# Altium footprint library SAMTEC SMD.PcbLib: 165 footprints (part 7 of 17) (continued)
## SAMTEC_GFZ-30-01-G-10-AD_TOP [mm] "Z-Beam, High Speed 300 Pins, Pitch 1.27mm, Low Profile 1.65mm, Grid Array (30x10) Solderless SMT Board Stacking Connector" (continued)
  region: 16.696,-4.152 17.586,-4.152 17.586,-5.042 16.696,-5.042
  region: 15.426,-4.152 16.316,-4.152 16.316,-5.042 15.426,-5.042
  region: 14.156,-4.152 15.046,-4.152 15.046,-5.042 14.156,-5.042
  region: 12.886,-4.152 13.776,-4.152 13.776,-5.042 12.886,-5.042
  region: 11.616,-4.152 12.506,-4.152 12.506,-5.042 11.616,-5.042
  region: 10.346,-4.152 11.236,-4.152 11.236,-5.042 10.346,-5.042
  region: 9.076,-4.152 9.966,-4.152 9.966,-5.042 9.076,-5.042
  region: 7.806,-4.152 8.696,-4.152 8.696,-5.042 7.806,-5.042
  region: 6.536,-4.152 7.426,-4.152 7.426,-5.042 6.536,-5.042
  region: 5.266,-4.152 6.156,-4.152 6.156,-5.042 5.266,-5.042
  region: 3.996,-4.152 4.886,-4.152 4.886,-5.042 3.996,-5.042
  region: 2.726,-4.152 3.616,-4.152 3.616,-5.042 2.726,-5.042
  region: 1.456,-4.152 2.346,-4.152 2.346,-5.042 1.456,-5.042
  region: 0.186,-4.152 1.076,-4.152 1.076,-5.042 0.186,-5.042
  region: -1.084,-4.152 -0.194,-4.152 -0.194,-5.042 -1.084,-5.042
  region: -2.354,-4.152 -1.464,-4.152 -1.464,-5.042 -2.354,-5.042
  region: -3.624,-4.152 -2.734,-4.152 -2.734,-5.042 -3.624,-5.042
  region: -4.894,-4.152 -4.004,-4.152 -4.004,-5.042 -4.894,-5.042
  region: -6.164,-4.152 -5.274,-4.152 -5.274,-5.042 -6.164,-5.042
  region: 16.696,-5.422 17.586,-5.422 17.586,-6.312 16.696,-6.312
  region: 15.426,-5.422 16.316,-5.422 16.316,-6.312 15.426,-6.312
  region: 14.156,-5.422 15.046,-5.422 15.046,-6.312 14.156,-6.312
  region: 12.886,-5.422 13.776,-5.422 13.776,-6.312 12.886,-6.312
  region: 11.616,-5.422 12.506,-5.422 12.506,-6.312 11.616,-6.312
  region: 10.346,-5.422 11.236,-5.422 11.236,-6.312 10.346,-6.312
  region: 9.076,-5.422 9.966,-5.422 9.966,-6.312 9.076,-6.312
  region: 7.806,-5.422 8.696,-5.422 8.696,-6.312 7.806,-6.312
  region: 6.536,-5.422 7.426,-5.422 7.426,-6.312 6.536,-6.312
  region: 5.266,-5.422 6.156,-5.422 6.156,-6.312 5.266,-6.312
  region: 3.996,-5.422 4.886,-5.422 4.886,-6.312 3.996,-6.312
  region: 2.726,-5.422 3.616,-5.422 3.616,-6.312 2.726,-6.312
  region: 1.456,-5.422 2.346,-5.422 2.346,-6.312 1.456,-6.312
  region: 0.186,-5.422 1.076,-5.422 1.076,-6.312 0.186,-6.312
  region: -1.084,-5.422 -0.194,-5.422 -0.194,-6.312 -1.084,-6.312
  region: -2.354,-5.422 -1.464,-5.422 -1.464,-6.312 -2.354,-6.312
  region: -3.624,-5.422 -2.734,-5.422 -2.734,-6.312 -3.624,-6.312
  region: -4.894,-5.422 -4.004,-5.422 -4.004,-6.312 -4.894,-6.312
  region: -6.164,-5.422 -5.274,-5.422 -5.274,-6.312 -6.164,-6.312
Bottom Layer keep-out:
  circle w0.1: c13.081,-10.16 r2.9
  circle w0.1: c13.081,10.16 r2.9
  circle w0.1: c-13.339,-10.16 r2.9
  circle w0.1: c-13.339,10.16 r2.9
Top Overlay:
  drawing of 311 lines, arcs and shapes, not listed
  text "300" at -21.131,-6.085 h1
  text "1" at 19.535,5.106 h1
Mechanical 8:
  drawing of 3026 lines, arcs and shapes, not listed
Mechanical 14:
  drawing of 487 lines, arcs and shapes, not listed
  text "300" at -21.131,-6.085 h1
  text "1" at 19.535,5.106 h1
Mechanical 15:
  lines w0.05: -24.531,-2.155 cw(c-21.869,0) -24.531,2.155 -20.849,2.155 -20.849,7.235 19.941,7.235 20.849,6.327 20.849,-1.655 24.531,-1.655 cw(c21.869,-3.81) 24.531,-5.965 20.849,-5.965 20.849,-7.235 -20.849,-7.235 -20.849,-2.155 -24.531,-2.155
3D body "SAMTEC_GFZ-30-01-G-10-AD_TOP.stp": height 2.92, standoff -1.27, extent -25.037,-6.985 25.037,6.985

## SAMTEC_HDWM-10-54-L-D-335-SM-P [mm] "20 Contacts - Pitch 1.27mm - Dual Row Straight SMD Micro Board Stacker"
height 11.05
pads (20):
  rect 0.76x2.79 smd: 1(-5.715,-2.615) 2(-5.715,2.615) 3(-4.445,-2.615) 4(-4.445,2.615) 5(-3.175,-2.615) 6(-3.175,2.615) 7(-1.905,-2.615) 8(-1.905,2.615) 9(-0.635,-2.615) 10(-0.635,2.615) 11(0.635,-2.615) 12(0.635,2.615) 13(1.905,-2.615) 14(1.905,2.615) 15(3.175,-2.615) 16(3.175,2.615) 17(4.445,-2.615) 18(4.445,2.615) 19(5.715,-2.615) 20(5.715,2.615)
Top Overlay:
  circle w0.25: c-6.775,-3.7 r0.125
  circle w0.25: c-6.775,-3.7 r0.125
  lines w0.2: -6.35,-0.87 -6.35,0.87 ; 6.35,-0.87 6.35,0.87
Mechanical 8:
  drawing of 164 lines, arcs and shapes, not listed
Mechanical 14:
  circle w0.1: c-6.773,-3.7 r0.25
  lines w0.1: -6.261,-1.854 -6.172,-2.489 -5.258,-2.489 -5.169,-1.854 ; -6.261,1.854 -6.172,2.489 -5.258,2.489 -5.169,1.854 ; -4.991,-1.854 -4.902,-2.489 -3.988,-2.489 -3.899,-1.854 ; -4.991,1.854 -4.902,2.489 -3.988,2.489 -3.899,1.854 ; -3.721,-1.854 -3.632,-2.489 -2.718,-2.489 -2.629,-1.854 ; -3.721,1.854 -3.632,2.489 -2.718,2.489 -2.629,1.854 ; -2.451,-1.854 -2.362,-2.489 -1.448,-2.489 -1.359,-1.854 ; -2.451,1.854 -2.362,2.489 -1.448,2.489 -1.359,1.854 ; -1.181,-1.854 -1.092,-2.489 -0.178,-2.489 -0.089,-1.854 ; -1.181,1.854 -1.092,2.489 -0.178,2.489 -0.089,1.854 ; 0.089,-1.854 0.178,-2.489 1.092,-2.489 1.181,-1.854 ; 0.089,1.854 0.178,2.489 1.092,2.489 1.181,1.854 ; 1.359,-1.854 1.448,-2.489 2.362,-2.489 2.451,-1.854 ; 1.359,1.854 1.448,2.489 2.362,2.489 2.451,1.854 ; 2.629,-1.854 2.718,-2.489 3.632,-2.489 3.721,-1.854 ; 2.629,1.854 2.718,2.489 3.632,2.489 3.721,1.854 ; 3.899,-1.854 3.988,-2.489 4.902,-2.489 4.991,-1.854 ; 3.899,1.854 3.988,2.489 4.902,2.489 4.991,1.854 ; 5.169,-1.854 5.258,-2.489 6.172,-2.489 6.261,-1.854 ; 5.169,1.854 5.258,2.489 6.172,2.489 6.261,1.854 ; -6.35,-1.854 6.35,-1.854 6.35,1.854 -6.35,1.854 -6.35,-1.854 ; -5.944,-1.499 -5.486,-1.499 -5.486,-1.041 -5.944,-1.041 -5.944,-1.499 ; -5.944,1.041 -5.486,1.041 -5.486,1.499 -5.944,1.499 -5.944,1.041 ; -4.674,-1.499 -4.216,-1.499 -4.216,-1.041 -4.674,-1.041 -4.674,-1.499 ; -4.674,1.041 -4.216,1.041 -4.216,1.499 -4.674,1.499 -4.674,1.041 ; -3.404,-1.499 -2.946,-1.499 -2.946,-1.041 -3.404,-1.041 -3.404,-1.499 ; -3.404,1.041 -2.946,1.041 -2.946,1.499 -3.404,1.499 -3.404,1.041 ; -2.134,-1.499 -1.676,-1.499 -1.676,-1.041 -2.134,-1.041 -2.134,-1.499 ; -2.134,1.041 -1.676,1.041 -1.676,1.499 -2.134,1.499 -2.134,1.041 ; -0.864,-1.499 -0.406,-1.499 -0.406,-1.041 -0.864,-1.041 -0.864,-1.499 ; -0.864,1.041 -0.406,1.041 -0.406,1.499 -0.864,1.499 -0.864,1.041 ; 0.406,-1.499 0.864,-1.499 0.864,-1.041 0.406,-1.041 0.406,-1.499 ; 0.406,1.041 0.864,1.041 0.864,1.499 0.406,1.499 0.406,1.041 ; 1.676,-1.499 2.134,-1.499 2.134,-1.041 1.676,-1.041 1.676,-1.499 ; 1.676,1.041 2.134,1.041 2.134,1.499 1.676,1.499 1.676,1.041 ; 2.946,-1.499 3.404,-1.499 3.404,-1.041 2.946,-1.041 2.946,-1.499 ; 2.946,1.041 3.404,1.041 3.404,1.499 2.946,1.499 2.946,1.041 ; 4.216,-1.499 4.674,-1.499 4.674,-1.041 4.216,-1.041 4.216,-1.499 ; 4.216,1.041 4.674,1.041 4.674,1.499 4.216,1.499 4.216,1.041 ; 5.486,-1.499 5.944,-1.499 5.944,-1.041 5.486,-1.041 5.486,-1.499 ; 5.486,1.041 5.944,1.041 5.944,1.499 5.486,1.499 5.486,1.041
Mechanical 15:
  lines w0.05: -6.6,-4.26 -6.6,4.26 6.6,4.26 6.6,-4.26 -6.6,-4.26
3D body "SAMTEC_HDWM-10-54-L-D-335-SM-P.stp": height 11.05, standoff 0, extent -6.35,-3.759 6.35,3.759

## SAMTEC_HDWM-10-59-L-D-450-SM-P [mm] "20 Contacts - Pitch 1.27mm - Dual Row Straight SMD Micro Board Stacker"
height 15.62
pads (20):
  rect 0.76x2.79 smd: 1(-5.715,-2.615) 2(-5.715,2.615) 3(-4.445,-2.615) 4(-4.445,2.615) 5(-3.175,-2.615) 6(-3.175,2.615) 7(-1.905,-2.615) 8(-1.905,2.615) 9(-0.635,-2.615) 10(-0.635,2.615) 11(0.635,-2.615) 12(0.635,2.615) 13(1.905,-2.615) 14(1.905,2.615) 15(3.175,-2.615) 16(3.175,2.615) 17(4.445,-2.615) 18(4.445,2.615) 19(5.715,-2.615) 20(5.715,2.615)
Top Overlay:
  circle w0.25: c-6.775,-3.7 r0.125
  circle w0.25: c-6.775,-3.7 r0.125
  lines w0.2: -6.35,-0.87 -6.35,0.87 ; 6.35,-0.87 6.35,0.87
Mechanical 8:
  drawing of 164 lines, arcs and shapes, not listed
Mechanical 14:
  circle w0.1: c-6.773,-3.7 r0.25
  lines w0.1: -6.261,-1.854 -6.172,-2.489 -5.258,-2.489 -5.169,-1.854 ; -6.261,1.854 -6.172,2.489 -5.258,2.489 -5.169,1.854 ; -4.991,-1.854 -4.902,-2.489 -3.988,-2.489 -3.899,-1.854 ; -4.991,1.854 -4.902,2.489 -3.988,2.489 -3.899,1.854 ; -3.721,-1.854 -3.632,-2.489 -2.718,-2.489 -2.629,-1.854 ; -3.721,1.854 -3.632,2.489 -2.718,2.489 -2.629,1.854 ; -2.451,-1.854 -2.362,-2.489 -1.448,-2.489 -1.359,-1.854 ; -2.451,1.854 -2.362,2.489 -1.448,2.489 -1.359,1.854 ; -1.181,-1.854 -1.092,-2.489 -0.178,-2.489 -0.089,-1.854 ; -1.181,1.854 -1.092,2.489 -0.178,2.489 -0.089,1.854 ; 0.089,-1.854 0.178,-2.489 1.092,-2.489 1.181,-1.854 ; 0.089,1.854 0.178,2.489 1.092,2.489 1.181,1.854 ; 1.359,-1.854 1.448,-2.489 2.362,-2.489 2.451,-1.854 ; 1.359,1.854 1.448,2.489 2.362,2.489 2.451,1.854 ; 2.629,-1.854 2.718,-2.489 3.632,-2.489 3.721,-1.854 ; 2.629,1.854 2.718,2.489 3.632,2.489 3.721,1.854 ; 3.899,-1.854 3.988,-2.489 4.902,-2.489 4.991,-1.854 ; 3.899,1.854 3.988,2.489 4.902,2.489 4.991,1.854 ; 5.169,-1.854 5.258,-2.489 6.172,-2.489 6.261,-1.854 ; 5.169,1.854 5.258,2.489 6.172,2.489 6.261,1.854 ; 6.1,-1.854 6.1,1.854 ; 6.35,-1.854 -6.35,-1.854 -6.35,1.854 6.35,1.854 ; -5.944,-1.499 -5.944,-1.041 -5.486,-1.041 -5.486,-1.499 -5.944,-1.499 ; -5.944,1.041 -5.944,1.499 -5.486,1.499 -5.486,1.041 -5.944,1.041 ; -4.674,-1.499 -4.674,-1.041 -4.216,-1.041 -4.216,-1.499 -4.674,-1.499 ; -4.674,1.041 -4.674,1.499 -4.216,1.499 -4.216,1.041 -4.674,1.041 ; -3.404,-1.499 -3.404,-1.041 -2.946,-1.041 -2.946,-1.499 -3.404,-1.499 ; -3.404,1.041 -3.404,1.499 -2.946,1.499 -2.946,1.041 -3.404,1.041 ; -2.134,-1.499 -2.134,-1.041 -1.676,-1.041 -1.676,-1.499 -2.134,-1.499 ; -2.134,1.041 -2.134,1.499 -1.676,1.499 -1.676,1.041 -2.134,1.041 ; -0.864,-1.499 -0.864,-1.041 -0.406,-1.041 -0.406,-1.499 -0.864,-1.499 ; -0.864,1.041 -0.864,1.499 -0.406,1.499 -0.406,1.041 -0.864,1.041 ; 0.406,-1.499 0.406,-1.041 0.864,-1.041 0.864,-1.499 0.406,-1.499 ; 0.406,1.041 0.406,1.499 0.864,1.499 0.864,1.041 0.406,1.041 ; 1.676,-1.499 1.676,-1.041 2.134,-1.041 2.134,-1.499 1.676,-1.499 ; 1.676,1.041 1.676,1.499 2.134,1.499 2.134,1.041 1.676,1.041 ; 2.946,-1.499 2.946,-1.041 3.404,-1.041 3.404,-1.499 2.946,-1.499 ; 2.946,1.041 2.946,1.499 3.404,1.499 3.404,1.041 2.946,1.041 ; 4.216,-1.499 4.216,-1.041 4.674,-1.041 4.674,-1.499 4.216,-1.499 ; 4.216,1.041 4.216,1.499 4.674,1.499 4.674,1.041 4.216,1.041 ; 5.486,-1.499 5.486,-1.041 5.944,-1.041 5.944,-1.499 5.486,-1.499 ; 5.486,1.041 5.486,1.499 5.944,1.499 5.944,1.041 5.486,1.041
Mechanical 15:
  lines w0.05: -6.6,-4.26 -6.6,4.26 6.6,4.26 6.6,-4.26 -6.6,-4.26
3D body "SAMTEC_HDWM-10-59-L-D-450-SM-P.stp": height 15.62, standoff 0, extent -6.35,-3.759 6.35,3.759

## SAMTEC_HDWM-20-54-L-D-335-SM-P [mm] "40 Contacts - Pitch 1.27mm - Dual Row Straight SMD Micro Board Stacker"
height 11.05
pads (40):
  rect 0.76x2.79 smd: 1(-12.065,-2.615) 2(-12.065,2.615) 3(-10.795,-2.615) 4(-10.795,2.615) 5(-9.525,-2.615) 6(-9.525,2.615) 7(-8.255,-2.615) 8(-8.255,2.615) 9(-6.985,-2.615) 10(-6.985,2.615) 11(-5.715,-2.615) 12(-5.715,2.615) 13(-4.445,-2.615) 14(-4.445,2.615) 15(-3.175,-2.615) 16(-3.175,2.615) 17(-1.905,-2.615) 18(-1.905,2.615) 19(-0.635,-2.615) 20(-0.635,2.615) 21(0.635,-2.615) 22(0.635,2.615) 23(1.905,-2.615) 24(1.905,2.615) 25(3.175,-2.615) 26(3.175,2.615) 27(4.445,-2.615) 28(4.445,2.615) 29(5.715,-2.615) 30(5.715,2.615) 31(6.985,-2.615) 32(6.985,2.615) 33(8.255,-2.615) 34(8.255,2.615) 35(9.525,-2.615) 36(9.525,2.615) 37(10.795,-2.615) 38(10.795,2.615) 39(12.065,-2.615) 40(12.065,2.615)
Top Overlay:
  circle w0.25: c-13.125,-3.7 r0.125
  circle w0.25: c-13.125,-3.7 r0.125
  lines w0.2: -12.7,-0.87 -12.7,0.87 ; 12.7,-0.87 12.7,0.87
Mechanical 8:
  drawing of 324 lines, arcs and shapes, not listed
Mechanical 14:
  drawing of 285 lines, arcs and shapes, not listed
Mechanical 15:
  lines w0.05: -12.95,-4.26 12.95,-4.26 12.95,4.26 -12.95,4.26 -12.95,-4.26
3D body "SAMTEC_HDWM-20-54-L-D-335-SM-P.stp": height 11.05, standoff 0, extent -12.7,-3.759 12.7,3.759

## SAMTEC_HDWM-20-59-L-D-450-SM-P [mm] "40 Contacts - Pitch 1.27mm - Dual Row Straight SMD Micro Board Stacker"
height 15.62
pads (40):
  rect 0.76x2.79 smd: 1(-12.065,-2.615) 2(-12.065,2.615) 3(-10.795,-2.615) 4(-10.795,2.615) 5(-9.525,-2.615) 6(-9.525,2.615) 7(-8.255,-2.615) 8(-8.255,2.615) 9(-6.985,-2.615) 10(-6.985,2.615) 11(-5.715,-2.615) 12(-5.715,2.615) 13(-4.445,-2.615) 14(-4.445,2.615) 15(-3.175,-2.615) 16(-3.175,2.615) 17(-1.905,-2.615) 18(-1.905,2.615) 19(-0.635,-2.615) 20(-0.635,2.615) 21(0.635,-2.615) 22(0.635,2.615) 23(1.905,-2.615) 24(1.905,2.615) 25(3.175,-2.615) 26(3.175,2.615) 27(4.445,-2.615) 28(4.445,2.615) 29(5.715,-2.615) 30(5.715,2.615) 31(6.985,-2.615) 32(6.985,2.615) 33(8.255,-2.615) 34(8.255,2.615) 35(9.525,-2.615) 36(9.525,2.615) 37(10.795,-2.615) 38(10.795,2.615) 39(12.065,-2.615) 40(12.065,2.615)
Top Overlay:
  circle w0.25: c-13.125,-3.7 r0.125
  circle w0.25: c-13.125,-3.7 r0.125
  lines w0.2: -12.7,-0.87 -12.7,0.87 ; 12.7,-0.87 12.7,0.87
Mechanical 8:
  drawing of 244 lines, arcs and shapes, not listed
Mechanical 14:
  drawing of 285 lines, arcs and shapes, not listed
Mechanical 15:
  lines w0.05: -12.95,-4.26 12.95,-4.26 12.95,4.26 -12.95,4.26 -12.95,-4.26
3D body "SAMTEC_HDWM-20-59-L-D-450-SM-P.stp": height 15.62, standoff 0, extent -12.7,-3.759 12.7,3.759

## SAMTEC_HTST-105-01-S-DV [mm] "10 Contacts - Pitch 2.54mm - Dual Row Surface Mount Straight Header"
height 10.16
pads (10):
  rect 1.27x5.08 smd: 1(-5.08,-3.43) 2(-5.08,3.43) 3(-2.54,-3.43) 4(-2.54,3.43) 5(0,-3.43) 6(0,3.43) 7(2.54,-3.43) 8(2.54,3.43) 9(5.08,-3.43) 10(5.08,3.43)
Top Overlay:
  circle w0.25: c-6.39,-5.57 r0.125
  circle w0.25: c-6.39,-5.57 r0.125
  lines w0.2: -6.065,-4.445 -10.16,-4.445 -10.16,4.826 -8.89,4.826 -8.89,4.445 -6.065,4.445 ; -6.065,-3.175 -8.89,-3.175 -8.89,3.175 -6.065,3.175 ; -4.095,-4.445 -3.525,-4.445 ; -4.095,-3.175 -3.525,-3.175 ; -4.095,3.175 -3.525,3.175 ; -4.095,4.445 -3.525,4.445 ; -1.555,-4.445 -0.985,-4.445 ; -1.555,-3.175 -0.985,-3.175 ; -1.555,3.175 -0.985,3.175 ; -1.555,4.445 -1.27,4.445 -1.27,4.826 -0.985,4.826 ; 0.985,-4.445 1.555,-4.445 ; 0.985,-3.175 1.555,-3.175 ; 0.985,3.175 1.555,3.175 ; 0.985,4.826 1.27,4.826 1.27,4.445 1.555,4.445 ; 3.525,-4.445 4.095,-4.445 ; 3.525,-3.175 4.095,-3.175 ; 3.525,3.175 4.095,3.175 ; 3.525,4.445 4.095,4.445 ; 6.065,-4.445 10.16,-4.445 10.16,4.826 8.89,4.826 8.89,4.445 6.065,4.445 ; 6.065,-3.175 8.89,-3.175 8.89,3.175 6.065,3.175
Mechanical 8:
  lines w0.05: -5.58,-3.43 -5.08,-3.43 ; -5.58,3.43 -5.08,3.43 ; -5.08,-3.93 -5.08,-3.43 ; -5.08,-2.93 -5.08,-3.43 ; -5.08,2.93 -5.08,3.43 ; -5.08,3.93 -5.08,3.43 ; -4.58,-3.43 -5.08,-3.43 ; -4.58,3.43 -5.08,3.43 ; -3.04,-3.43 -2.54,-3.43 ; -3.04,3.43 -2.54,3.43 ; -2.54,-3.93 -2.54,-3.43 ; -2.54,-2.93 -2.54,-3.43 ; -2.54,2.93 -2.54,3.43 ; -2.54,3.93 -2.54,3.43 ; -2.04,-3.43 -2.54,-3.43 ; -2.04,3.43 -2.54,3.43 ; -0.5,-3.43 0,-3.43 ; -0.5,0 0,0 ; -0.5,3.43 0,3.43 ; 0,-3.93 0,-3.43 ; 0,-2.93 0,-3.43 ; 0,-0.5 0,0 ; 0,0.5 0,0 ; 0,2.93 0,3.43 ; 0,3.93 0,3.43 ; 0.5,-3.43 0,-3.43 ; 0.5,0 0,0 ; 0.5,3.43 0,3.43 ; 2.04,-3.43 2.54,-3.43 ; 2.04,3.43 2.54,3.43 ; 2.54,-3.93 2.54,-3.43 ; 2.54,-2.93 2.54,-3.43 ; 2.54,2.93 2.54,3.43 ; 2.54,3.93 2.54,3.43 ; 3.04,-3.43 2.54,-3.43 ; 3.04,3.43 2.54,3.43 ; 4.58,-3.43 5.08,-3.43 ; 4.58,3.43 5.08,3.43 ; 5.08,-3.93 5.08,-3.43 ; 5.08,-2.93 5.08,-3.43 ; 5.08,2.93 5.08,3.43 ; 5.08,3.93 5.08,3.43 ; 5.58,-3.43 5.08,-3.43 ; 5.58,3.43 5.08,3.43 ; -5.715,-5.97 -5.715,-0.89 -4.445,-0.89 -4.445,-5.97 -5.715,-5.97 ; -5.715,0.89 -5.715,5.97 -4.445,5.97 -4.445,0.89 -5.715,0.89 ; -3.175,-5.97 -3.175,-0.89 -1.905,-0.89 -1.905,-5.97 -3.175,-5.97 ; -3.175,0.89 -3.175,5.97 -1.905,5.97 -1.905,0.89 -3.175,0.89 ; -0.635,-5.97 -0.635,-0.89 0.635,-0.89 0.635,-5.97 -0.635,-5.97 ; -0.635,0.89 -0.635,5.97 0.635,5.97 0.635,0.89 -0.635,0.89 ; 1.905,-5.97 1.905,-0.89 3.175,-0.89 3.175,-5.97 1.905,-5.97 ; 1.905,0.89 1.905,5.97 3.175,5.97 3.175,0.89 1.905,0.89 ; 4.445,-5.97 4.445,-0.89 5.715,-0.89 5.715,-5.97 4.445,-5.97 ; 4.445,0.89 4.445,5.97 5.715,5.97 5.715,0.89 4.445,0.89
Mechanical 14:
  circle w0.1: c-6.388,-5.57 r0.25
  lines w0.1: -5.715,-4.445 -5.715,-4.191 -4.445,-4.191 -4.445,-4.445 ; -5.397,-4.445 -5.397,-5.588 -4.763,-5.588 -4.763,-4.445 ; -5.397,4.445 -5.397,5.588 -4.763,5.588 -4.763,4.445 ; -2.857,-4.445 -2.857,-5.588 -2.222,-5.588 -2.222,-4.445 ; -2.857,4.445 -2.857,5.588 -2.222,5.588 -2.222,4.445 ; -2.54,-4.445 -2.54,-3.175 ; -0.318,-4.445 -0.318,-5.588 0.318,-5.588 0.318,-4.445 ; -0.318,4.826 -0.318,5.588 0.318,5.588 0.318,4.826 ; 2.222,-4.445 2.222,-5.588 2.857,-5.588 2.857,-4.445 ; 2.222,4.445 2.222,5.588 2.857,5.588 2.857,4.445 ; 2.54,-4.445 2.54,-3.175 ; 4.763,-4.445 4.763,-5.588 5.397,-5.588 5.397,-4.445 ; 4.763,4.445 4.763,5.588 5.397,5.588 5.397,4.445 ; -10.16,-4.445 10.16,-4.445 10.16,4.826 8.89,4.826 8.89,4.445 1.27,4.445 1.27,4.826 -1.27,4.826 -1.27,4.445 -8.89,4.445 -8.89,4.826 -10.16,4.826 -10.16,-4.445 ; -8.89,-3.175 8.89,-3.175 8.89,3.175 -8.89,3.175 -8.89,-3.175 ; -5.397,-1.587 -4.763,-1.587 -4.763,-0.953 -5.397,-0.953 -5.397,-1.587 ; -5.397,0.953 -5.397,1.587 -4.763,1.587 -4.763,0.953 -5.397,0.953 ; -2.857,-1.587 -2.222,-1.587 -2.222,-0.953 -2.857,-0.953 -2.857,-1.587 ; -2.857,0.953 -2.857,1.587 -2.222,1.587 -2.222,0.953 -2.857,0.953 ; -0.318,-1.587 0.318,-1.587 0.318,-0.953 -0.318,-0.953 -0.318,-1.587 ; -0.318,0.953 -0.318,1.587 0.318,1.587 0.318,0.953 -0.318,0.953 ; 2.222,-1.587 2.857,-1.587 2.857,-0.953 2.222,-0.953 2.222,-1.587 ; 2.222,0.953 2.222,1.587 2.857,1.587 2.857,0.953 2.222,0.953 ; 4.763,-1.587 5.397,-1.587 5.397,-0.953 4.763,-0.953 4.763,-1.587 ; 4.763,0.953 4.763,1.587 5.397,1.587 5.397,0.953 4.763,0.953
Mechanical 15:
  lines w0.05: -10.41,-6.22 -10.41,6.22 10.41,6.22 10.41,-6.22 -10.41,-6.22
3D body "SAMTEC_HTST-105-01-S-DV.stp": height 10.16, standoff 0, extent -10.16,-5.588 10.16,5.588

## SAMTEC_LSHM-130-01-L-DH-A-N [mm] "60 Contacts, Pitch 0.5mm, Razor Beam™ Right Angled High Speed Hermaphroditic Strip (Witout Shield)"
height 5.13
pads (64):
  rect 0.3x1.8 smd: 1(7.244,-0.003) 2(7.244,-2.753) 3(6.744,-0.003) 4(6.744,-2.753) 5(6.244,-0.003) 6(6.244,-2.753) 7(5.744,-0.003) 8(5.744,-2.753) 9(5.244,-0.003) 10(5.244,-2.753) 11(4.744,-0.003) 12(4.744,-2.753) 13(4.244,-0.003) 14(4.244,-2.753) 15(3.744,-0.003) 16(3.744,-2.753) 17(3.244,-0.003) 18(3.244,-2.753) 19(2.744,-0.003) 20(2.744,-2.753) 21(2.244,-0.003) 22(2.244,-2.753) 23(1.744,-0.003) 24(1.744,-2.753) 25(1.244,-0.003) 26(1.244,-2.753) 27(0.744,-0.003) 28(0.744,-2.753) 29(0.244,-0.003) 30(0.244,-2.753) 31(-0.256,-0.003) 32(-0.256,-2.753) 33(-0.756,-0.003) 34(-0.756,-2.753) 35(-1.256,-0.003) 36(-1.256,-2.753) 37(-1.756,-0.003) 38(-1.756,-2.753) 39(-2.256,-0.003) 40(-2.256,-2.753) 41(-2.756,-0.003) 42(-2.756,-2.753) 43(-3.256,-0.003) 44(-3.256,-2.753) 45(-3.756,-0.003) 46(-3.756,-2.753) 47(-4.256,-0.003) 48(-4.256,-2.753) 49(-4.756,-0.003) 50(-4.756,-2.753) 51(-5.256,-0.003) 52(-5.256,-2.753) 53(-5.756,-0.003) 54(-5.756,-2.753) 55(-6.256,-0.003) 56(-6.256,-2.753) 57(-6.756,-0.003) 58(-6.756,-2.753) 59(-7.256,-0.003) 60(-7.256,-2.753)
  round 1.7 hole 1: 61(-8.456,-7.253) 62(8.444,-7.253)
  round 0.5 hole 1.45 unplated mask+0.475: 63(-8.006,-4.803) 64(7.994,-4.803)
Top Overlay:
  drawing of 157 lines, arcs and shapes, not listed
Mechanical 8:
  drawing of 386 lines, arcs and shapes, not listed
Mechanical 14:
  drawing of 175 lines, arcs and shapes, not listed
Mechanical 15:
  lines w0.05: -10.15,-8.703 -10.15,-1.903 -9.065,-1.903 -9.065,-0.403 -7.656,-0.403 -7.656,1.147 7.644,1.147 7.644,-0.403 9.065,-0.403 9.065,-1.903 10.15,-1.903 10.15,-8.703 -10.15,-8.703
3D body "SAMTEC_LSHM-130-01-L-DH-A-N.stp": height 5.13, standoff -1.4, extent -9.9,-8.452 9.9,0.55

## SAMTEC_LSHM-130-02.5-F-DV-A-S-TR [mm] "60 Contacts, Pitch 0.5mm, Razor Beam™ Vertical High Speed Hermaphroditic Strip, With Shield, Lead Style -02.5"
height 3.95
pads (64):
  rect 0.3x1.5 smd: 1(7.25,-1.9) 2(7.25,1.8) 3(6.75,-1.9) 4(6.75,1.8) 5(6.25,-1.9) 6(6.25,1.8) 7(5.75,-1.9) 8(5.75,1.8) 9(5.25,-1.9) 10(5.25,1.8) 11(4.75,-1.9) 12(4.75,1.8) 13(4.25,-1.9) 14(4.25,1.8) 15(3.75,-1.9) 16(3.75,1.8) 17(3.25,-1.9) 18(3.25,1.8) 19(2.75,-1.9) 20(2.75,1.8) 21(2.25,-1.9) 22(2.25,1.8) 23(1.75,-1.9) 24(1.75,1.8) 25(1.25,-1.9) 26(1.25,1.8) 27(0.75,-1.9) 28(0.75,1.8) 29(0.25,-1.9) 30(0.25,1.8) 31(-0.25,-1.9) 32(-0.25,1.8) 33(-0.75,-1.9) 34(-0.75,1.8) 35(-1.25,-1.9) 36(-1.25,1.8) 37(-1.75,-1.9) 38(-1.75,1.8) 39(-2.25,-1.9) 40(-2.25,1.8) 41(-2.75,-1.9) 42(-2.75,1.8) 43(-3.25,-1.9) 44(-3.25,1.8) 45(-3.75,-1.9) 46(-3.75,1.8) 47(-4.25,-1.9) 48(-4.25,1.8) 49(-4.75,-1.9) 50(-4.75,1.8) 51(-5.25,-1.9) 52(-5.25,1.8) 53(-5.75,-1.9) 54(-5.75,1.8) 55(-6.25,-1.9) 56(-6.25,1.8) 57(-6.75,-1.9) 58(-6.75,1.8) 59(-7.25,-1.9) 60(-7.25,1.8)
  round 2 hole 1: 61(-9.975,1.1) 61(9.975,1.1)
  round 0.5 hole 1.5 unplated mask+0.5: P1(-8.5,-0.9) P2(8.5,-0.9)
Top Overlay:
  circle w0.25: c7.25,-3.25 r0.125
  lines w0.2: -10.025,-0.249 -10.025,-0.34 -10.311,-0.409 ccw(c-10.299,-0.458) -10.349,-0.458 -10.349,-1.143 ccw(c-10.299,-1.143) -10.311,-1.192 -10.025,-1.261 -10.025,-2.14 ccw(c-9.625,-2.14) -9.625,-2.54 -7.75,-2.54 ; -9.825,-0.242 -9.825,-2.14 ccw(c-9.625,-2.14) -9.625,-2.34 -7.75,-2.34 ; -9.726,2.427 cw(c-9.625,2.04) -9.625,2.44 -7.75,2.44 ; -9.252,2.24 -7.75,2.24 ; -8.671,1.45 -8.035,1.45 -8.035,0.85 -7.75,0.85 ; -7.802,-0.05 7.802,-0.05 ; -7.375,-0.8 -7.375,-0.625 -7.125,-0.625 -7.125,-0.8 ; -7.35,0.7 -7.35,0.602 -7.15,0.602 -7.15,0.7 ; -6.875,-0.8 -6.875,-0.625 -6.625,-0.625 -6.625,-0.8 ; -6.85,0.7 -6.85,0.602 -6.65,0.602 -6.65,0.7 ; -6.375,-0.8 -6.375,-0.625 -6.125,-0.625 -6.125,-0.8 ; -5.875,-0.8 -5.875,-0.625 -5.625,-0.625 -5.625,-0.8 ; -5.375,-0.8 -5.375,-0.625 -5.125,-0.625 -5.125,-0.8 ; -4.875,-0.8 -4.875,-0.625 -4.625,-0.625 -4.625,-0.8 ; -4.375,-0.8 -4.375,-0.625 -4.125,-0.625 -4.125,-0.8 ; -3.875,-0.8 -3.875,-0.625 -3.625,-0.625 -3.625,-0.8 ; -3.375,-0.8 -3.375,-0.625 -3.125,-0.625 -3.125,-0.8 ; -2.875,-0.8 -2.875,-0.625 -2.625,-0.625 -2.625,-0.8 ; -2.375,-0.8 -2.375,-0.625 -2.125,-0.625 -2.125,-0.8 ; -1.875,-0.8 -1.875,-0.625 -1.625,-0.625 -1.625,-0.8 ; -1.375,-0.8 -1.375,-0.625 -1.125,-0.625 -1.125,-0.8 ; -0.875,-0.8 -0.875,-0.625 -0.625,-0.625 -0.625,-0.8 ; -0.375,-0.8 -0.375,-0.625 -0.125,-0.625 -0.125,-0.8 ; 0.125,-0.8 0.125,-0.625 0.375,-0.625 0.375,-0.8 ; 0.625,-0.8 0.625,-0.625 0.875,-0.625 0.875,-0.8 ; 1.125,-0.8 1.125,-0.625 1.375,-0.625 1.375,-0.8 ; 1.625,-0.8 1.625,-0.625 1.875,-0.625 1.875,-0.8 ; 2.125,-0.8 2.125,-0.625 2.375,-0.625 2.375,-0.8 ; 2.625,-0.8 2.625,-0.625 2.875,-0.625 2.875,-0.8 ; 3.125,-0.8 3.125,-0.625 3.375,-0.625 3.375,-0.8 ; 3.625,-0.8 3.625,-0.625 3.875,-0.625 3.875,-0.8 ; 4.125,-0.8 4.125,-0.625 4.375,-0.625 4.375,-0.8 ; 4.625,-0.8 4.625,-0.625 4.875,-0.625 4.875,-0.8 ; 5.125,-0.8 5.125,-0.625 5.375,-0.625 5.375,-0.8 ; 5.625,-0.8 5.625,-0.625 5.875,-0.625 5.875,-0.8 ; 6.125,-0.8 6.125,-0.625 6.375,-0.625 6.375,-0.8 ; 6.625,-0.8 6.625,-0.625 6.875,-0.625 6.875,-0.8 ; 6.65,0.7 6.65,0.602 6.85,0.602 6.85,0.7 ; 7.125,-0.8 7.125,-0.625 7.375,-0.625 7.375,-0.8 ; 7.15,0.7 7.15,0.602 7.35,0.602 7.35,0.7 ; 7.75,-2.54 9.625,-2.54 ccw(c9.625,-2.14) 10.025,-2.14 10.025,-1.261 10.311,-1.192 ccw(c10.299,-1.143) 10.349,-1.143 10.349,-0.458 ccw(c10.299,-0.458) 10.311,-0.409 10.025,-0.34 10.025,-0.249 ; 7.75,-2.34 9.625,-2.34 ccw(c9.625,-2.14) 9.825,-2.14 9.825,-0.242 ; 7.75,0.85 8.035,0.85 8.035,1.45 8.671,1.45 ; 7.75,2.24 9.252,2.24 ; 7.75,2.44 9.625,2.44 cw(c9.625,2.04) 9.726,2.427
Mechanical 8:
  lines w0.05: -10.475,1.1 -9.975,1.1 ; -9.975,0.6 -9.975,1.1 ; -9.975,1.6 -9.975,1.1 ; -9.475,1.1 -9.975,1.1 ; -9,-0.9 -8.5,-0.9 ; -8.5,-1.4 -8.5,-0.9 ; -8.5,-0.4 -8.5,-0.9 ; -8,-0.9 -8.5,-0.9 ; -0.5,0 0,0 ; 0,-0.5 0,0 ; 0,0.5 0,0 ; 0.5,0 0,0 ; 8,-0.9 8.5,-0.9 ; 8.5,-1.4 8.5,-0.9 ; 8.5,-0.4 8.5,-0.9 ; 9,-0.9 8.5,-0.9 ; 9.475,1.1 9.975,1.1 ; 9.975,0.6 9.975,1.1 ; 9.975,1.6 9.975,1.1 ; 10.475,1.1 9.975,1.1
  lines w0.1: -8.2,0.705 -8.8,1.1 ; -8.2,1.505 -8.8,1.1 ; 8.2,0.695 8.8,1.1 ; 8.2,1.495 8.8,1.1 ; -8.8,1.1 8.8,1.1
  text "To be Soldered using Paste in Hole Technology" at -8.2,1.8 h0.5
Mechanical 14:
  drawing of 373 lines, arcs and shapes, not listed
Mechanical 15:
  lines w0.05: -11.225,-2.9 11.225,-2.9 11.225,2.8 -11.225,2.8 -11.225,-2.9
3D body "SAMTEC_LSHM-130-02.5-F-DV-A-S-TR.stp": height 3.95, standoff -1.65, extent -10.349,-2.54 10.348,2.44

## SAMTEC_LSHM-130-04.0-L-DV-A-N [mm] "60 Contacts, Pitch 0.5mm, Razor Beam Vertical High Speed Hermaphroditic Strip (Witout Shield)"
height 5.45
pads (62):
  rect 0.3x1.5 smd: 1(7.25,-1.9) 2(7.25,1.8) 3(6.75,-1.9) 4(6.75,1.8) 5(6.25,-1.9) 6(6.25,1.8) 7(5.75,-1.9) 8(5.75,1.8) 9(5.25,-1.9) 10(5.25,1.8) 11(4.75,-1.9) 12(4.75,1.8) 13(4.25,-1.9) 14(4.25,1.8) 15(3.75,-1.9) 16(3.75,1.8) 17(3.25,-1.9) 18(3.25,1.8) 19(2.75,-1.9) 20(2.75,1.8) 21(2.25,-1.9) 22(2.25,1.8) 23(1.75,-1.9) 24(1.75,1.8) 25(1.25,-1.9) 26(1.25,1.8) 27(0.75,-1.9) 28(0.75,1.8) 29(0.25,-1.9) 30(0.25,1.8) 31(-0.25,-1.9) 32(-0.25,1.8) 33(-0.75,-1.9) 34(-0.75,1.8) 35(-1.25,-1.9) 36(-1.25,1.8) 37(-1.75,-1.9) 38(-1.75,1.8) 39(-2.25,-1.9) 40(-2.25,1.8) 41(-2.75,-1.9) 42(-2.75,1.8) 43(-3.25,-1.9) 44(-3.25,1.8) 45(-3.75,-1.9) 46(-3.75,1.8) 47(-4.25,-1.9) 48(-4.25,1.8) 49(-4.75,-1.9) 50(-4.75,1.8) 51(-5.25,-1.9) 52(-5.25,1.8) 53(-5.75,-1.9) 54(-5.75,1.8) 55(-6.25,-1.9) 56(-6.25,1.8) 57(-6.75,-1.9) 58(-6.75,1.8) 59(-7.25,-1.9) 60(-7.25,1.8)
  round 0.5 hole 1.5 unplated mask+0.5: 61(-8.5,-0.9) 62(8.5,-0.9)
Top Overlay:
  drawing of 203 lines, arcs and shapes, not listed
Mechanical 8:
  drawing of 372 lines, arcs and shapes, not listed
Mechanical 14:
  drawing of 376 lines, arcs and shapes, not listed
Mechanical 15:
  lines w0.05: -10.15,-2.9 -10.15,2.8 10.15,2.8 10.15,-2.9 -10.15,-2.9
3D body "SAMTEC_LSHM-130-04.0-L-DV-A-N.stp": height 5.45, standoff -0.85, extent -9.9,-2.54 9.9,2.59